# Altium footprint library Connector_art.PcbLib: 209 footprints (part 7 of 14)
Each footprint in its own frame and in the unit in brackets; x right, y up, seen from the top. Pads: shape width x height; smd on the part's side, far side on the other; paste and mask are expansions set on the pad; w line width, h text height; cw(c..) or ccw(c..) is an arc to the next point about the centre after c.
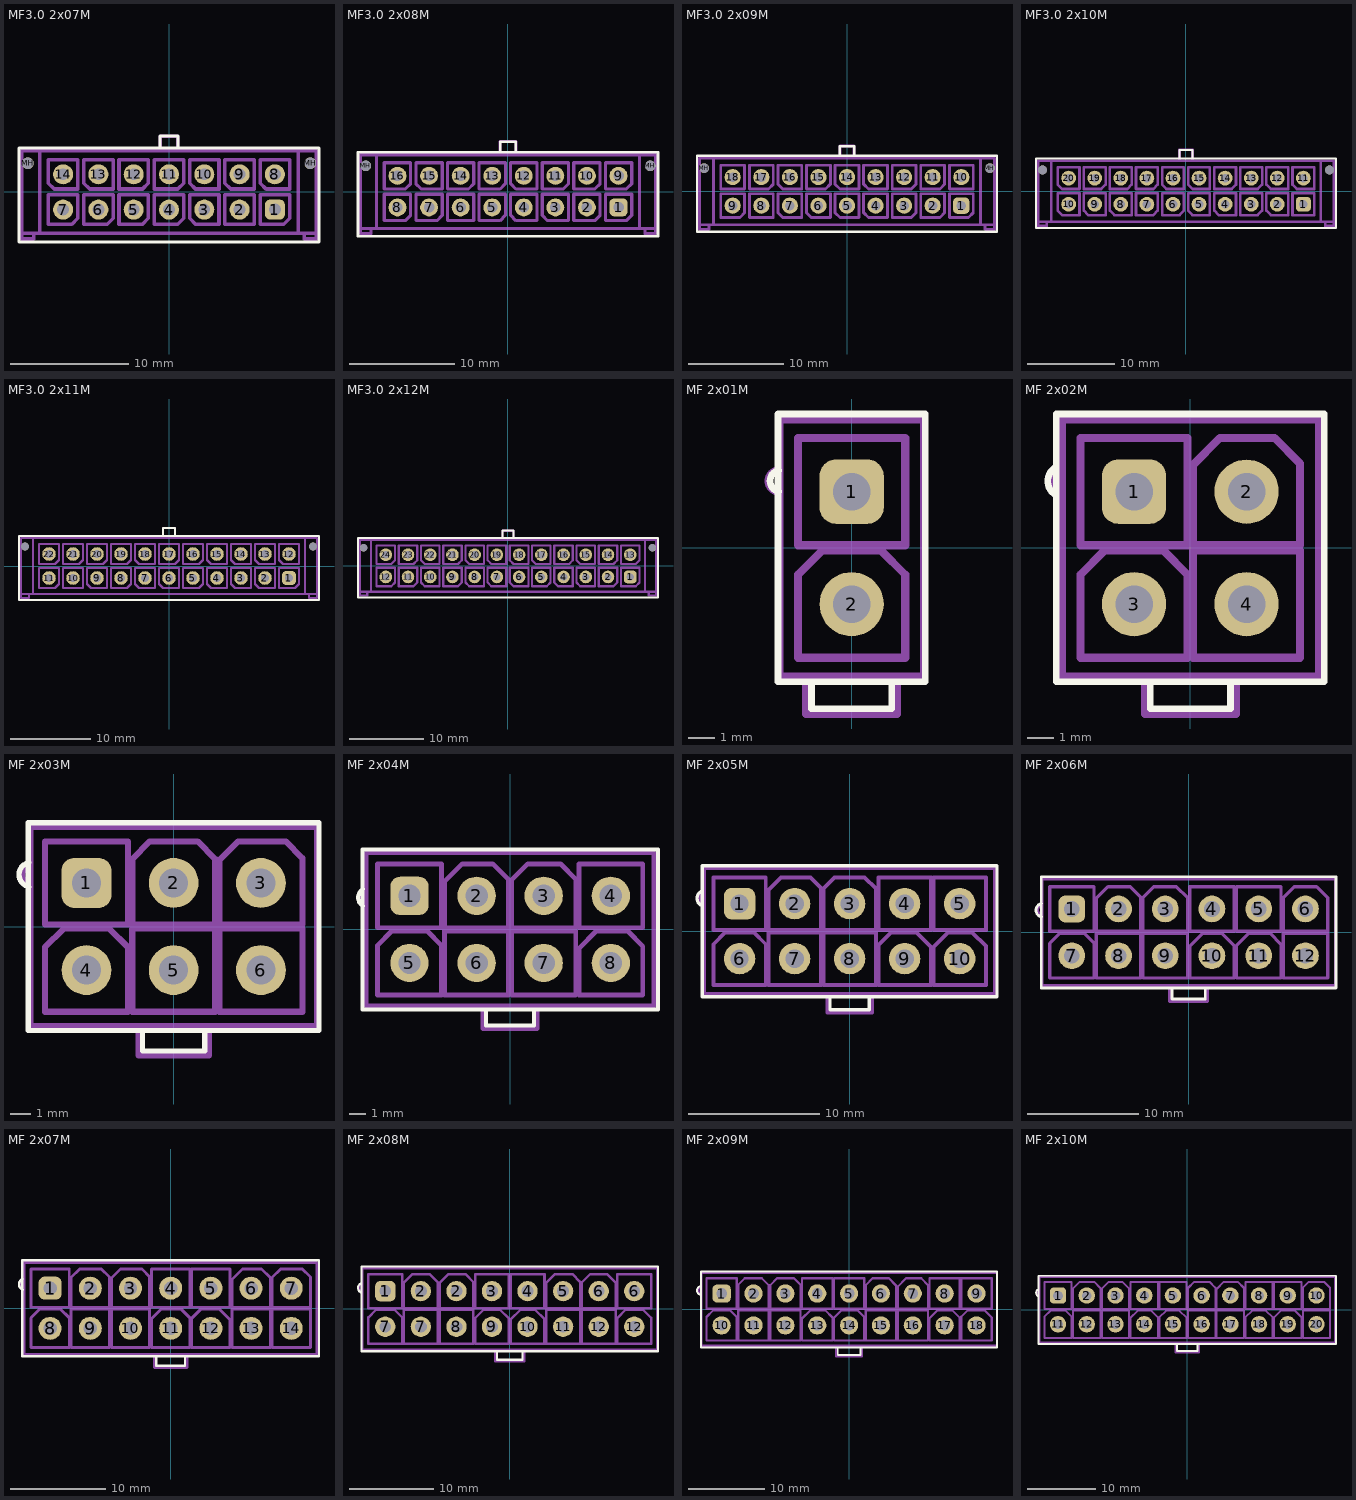
[diagram p6: the footprints below, top view; thin cyan lines are the x and y axes]

## MF3.0 2x07M [mm]
height 9.91
pads (16):
  rrect50% 1.7x1.7 hole 1 paste+0: 1(9,-1.5)
  round 1.7 hole 1: 2(6,-1.5) 3(3,-1.5) 4(0,-1.5) 5(-3,-1.5) 6(-6,-1.5) 7(-9,-1.5) 8(9,1.5) 9(6,1.5) 10(3,1.5) 11(0,1.5) 12(-3,1.5) 13(-6,1.5) 14(-9,1.5)
  round 1 hole 1 unplated: MH(-12,2.44) MH(12,2.44)
Top Overlay:
  lines w0.25: -0.75,3.75 -0.75,4.75 0.75,4.75 0.75,3.75 ; -12.75,-4.25 -12.75,3.75 12.75,3.75 12.75,-4.25 -12.75,-4.25
Mechanical 1:
  lines w0.3: -11.5,-3.5 -11.5,-4 -12.5,-4 -12.5,-3.5 ; -0.75,3.5 -0.75,4.75 0.75,4.75 0.75,3.5 ; 11.5,-3.5 11.5,-4 12.5,-4 12.5,-3.5 ; -12.5,-3.5 -12.5,3.5 -11,3.5 ; -12.5,-3.5 -11,-3.5 ; -11,-3.5 -11,3.5 ; -11,-3.5 11,-3.5 ; -11,3.5 11,3.5 ; 11,-3.5 11,3.5 ; 11,-3.5 12.5,-3.5 ; 11,3.5 12.5,3.5 12.5,-3.5 ; -10.25,-2.75 -8.25,-2.75 -7.75,-2.25 -7.75,-0.25 -10.25,-0.25 -10.25,-2.75 ; -10.25,0.75 -9.75,0.25 -7.75,0.25 -7.75,2.75 -10.25,2.75 -10.25,0.75 ; -7.25,-2.75 -5.25,-2.75 -4.75,-2.25 -4.75,-0.25 -7.25,-0.25 -7.25,-2.75 ; -7.25,0.75 -7.25,2.75 -4.75,2.75 -4.75,0.25 -6.75,0.25 -7.25,0.75 ; -4.25,-2.75 -4.25,-0.25 -1.75,-0.25 -1.75,-2.25 -2.25,-2.75 -4.25,-2.75 ; -4.25,0.25 -4.25,2.75 -1.75,2.75 -1.75,0.75 -2.25,0.25 -4.25,0.25 ; -1.25,-2.75 0.75,-2.75 1.25,-2.25 1.25,-0.25 -1.25,-0.25 -1.25,-2.75 ; -1.25,0.25 -1.25,2.75 1.25,2.75 1.25,0.75 0.75,0.25 -1.25,0.25 ; 1.75,-2.25 2.25,-2.75 4.25,-2.75 4.25,-0.25 1.75,-0.25 1.75,-2.25 ; 1.75,0.75 1.75,2.75 4.25,2.75 4.25,0.25 2.25,0.25 1.75,0.75 ; 4.75,-2.75 4.75,-0.25 7.25,-0.25 7.25,-2.75 4.75,-2.75 ; 4.75,0.75 4.75,2.75 7.25,2.75 7.25,0.25 5.25,0.25 4.75,0.75 ; 7.75,-2.75 9.75,-2.75 10.25,-2.25 10.25,-0.25 7.75,-0.25 7.75,-2.75 ; 7.75,0.75 7.75,2.75 10.25,2.75 10.25,0.25 8.25,0.25 7.75,0.75
3D body: height 9.91, standoff -3.18, extent -12.575,-3.97 12.575,4.8

## MF3.0 2x08M [mm]
height 9.91
pads (18):
  rrect50% 1.7x1.7 hole 1 paste+0: 1(10.5,-1.5)
  round 1.7 hole 1: 2(7.5,-1.5) 3(4.5,-1.5) 4(1.5,-1.5) 5(-1.5,-1.5) 6(-4.5,-1.5) 7(-7.5,-1.5) 8(-10.5,-1.5) 9(10.5,1.5) 10(7.5,1.5) 11(4.5,1.5) 12(1.5,1.5) 13(-1.5,1.5) 14(-4.5,1.5) 15(-7.5,1.5) 16(-10.5,1.5)
  round 1 hole 1 unplated: MH(-13.5,2.44) MH(13.5,2.44)
Top Overlay:
  lines w0.25: -0.75,3.75 -0.75,4.75 0.75,4.75 0.75,3.75 ; -14.25,-4.25 14.25,-4.25 14.25,3.75 -14.25,3.75 -14.25,-4.25
Mechanical 1:
  lines w0.3: -13,-3.5 -13,-4 -14,-4 -14,-3.5 ; -0.75,3.5 -0.75,4.75 0.75,4.75 0.75,3.5 ; 13,-3.5 13,-4 14,-4 14,-3.5 ; -14,-3.5 -12.5,-3.5 ; -14,-3.5 -14,3.5 -12.5,3.5 ; -12.5,-3.5 12.5,-3.5 ; -12.5,-3.5 -12.5,3.5 ; -12.5,3.5 12.5,3.5 ; 12.5,-3.5 14,-3.5 ; 12.5,-3.5 12.5,3.5 ; 12.5,3.5 14,3.5 14,-3.5 ; -11.75,-2.75 -9.75,-2.75 -9.25,-2.25 -9.25,-0.25 -11.75,-0.25 -11.75,-2.75 ; -11.75,0.25 -9.75,0.25 -9.25,0.75 -9.25,2.75 -11.75,2.75 -11.75,0.25 ; -8.75,-2.75 -8.75,-0.25 -6.25,-0.25 -6.25,-2.25 -6.75,-2.75 -8.75,-2.75 ; -8.75,0.75 -8.25,0.25 -6.25,0.25 -6.25,2.75 -8.75,2.75 -8.75,0.75 ; -5.75,-2.75 -3.25,-2.75 -3.25,-0.25 -5.75,-0.25 -5.75,-2.75 ; -5.75,0.25 -3.75,0.25 -3.25,0.75 -3.25,2.75 -5.75,2.75 -5.75,0.25 ; -2.75,-2.75 -0.75,-2.75 -0.25,-2.25 -0.25,-0.25 -2.75,-0.25 -2.75,-2.75 ; -2.75,0.25 -0.75,0.25 -0.25,0.75 -0.25,2.75 -2.75,2.75 -2.75,0.25 ; 0.25,-2.25 0.75,-2.75 2.75,-2.75 2.75,-0.25 0.25,-0.25 0.25,-2.25 ; 0.25,0.75 0.75,0.25 2.75,0.25 2.75,2.75 0.25,2.75 0.25,0.75 ; 3.25,-2.25 3.25,-0.25 5.75,-0.25 5.75,-2.75 3.75,-2.75 3.25,-2.25 ; 3.25,0.25 5.25,0.25 5.75,0.75 5.75,2.75 3.25,2.75 3.25,0.25 ; 6.25,-2.75 8.25,-2.75 8.75,-2.25 8.75,-0.25 6.25,-0.25 6.25,-2.75 ; 6.25,0.25 8.25,0.25 8.75,0.75 8.75,2.75 6.25,2.75 6.25,0.25 ; 9.25,-2.75 11.25,-2.75 11.75,-2.25 11.75,-0.25 9.25,-0.25 9.25,-2.75 ; 9.25,0.25 11.25,0.25 11.75,0.75 11.75,2.75 9.25,2.75 9.25,0.25
3D body: height 9.91, standoff -3.18, extent -14.075,-3.97 14.075,4.8

## MF3.0 2x09M [mm]
height 9.91
pads (20):
  rrect50% 1.7x1.7 hole 1 paste+0: 1(12,-1.5)
  round 1.7 hole 1: 2(9,-1.5) 3(6,-1.5) 4(3,-1.5) 5(0,-1.5) 6(-3,-1.5) 7(-6,-1.5) 8(-9,-1.5) 9(-12,-1.5) 10(12,1.5) 11(9,1.5) 12(6,1.5) 13(3,1.5) 14(0,1.5) 15(-3,1.5) 16(-6,1.5) 17(-9,1.5) 18(-12,1.5)
  round 1 hole 1 unplated: MH(-15,2.44) MH(15,2.44)
Top Overlay:
  lines w0.25: -0.75,3.75 -0.75,4.75 0.75,4.75 0.75,3.75 ; -15.75,-4.25 -15.75,3.75 15.75,3.75 15.75,-4.25 -15.75,-4.25
Mechanical 1:
  lines w0.3: -14.5,-3.5 -14.5,-4 -15.5,-4 -15.5,-3.5 ; -0.75,3.5 -0.75,4.75 0.75,4.75 0.75,3.5 ; 14.5,-3.5 14.5,-4 15.5,-4 15.5,-3.5 ; -15.5,-3.5 -15.5,3.5 -14,3.5 ; -15.5,-3.5 -14,-3.5 ; -14,-3.5 -14,3.5 ; -14,-3.5 14,-3.5 ; -14,3.5 14,3.5 ; 14,-3.5 14,3.5 ; 14,-3.5 15.5,-3.5 ; 14,3.5 15.5,3.5 15.5,-3.5 ; -13.25,-2.75 -13.25,-0.25 -10.75,-0.25 -10.75,-2.25 -11.25,-2.75 -13.25,-2.75 ; -13.25,0.25 -13.25,2.75 -10.75,2.75 -10.75,0.25 -13.25,0.25 ; -10.25,-2.75 -7.75,-2.75 -7.75,-0.25 -10.25,-0.25 -10.25,-2.75 ; -10.25,0.25 -8.25,0.25 -7.75,0.75 -7.75,2.75 -10.25,2.75 -10.25,0.25 ; -7.25,-2.25 -7.25,-0.25 -4.75,-0.25 -4.75,-2.75 -6.75,-2.75 -7.25,-2.25 ; -7.25,0.75 -7.25,2.75 -4.75,2.75 -4.75,0.25 -6.75,0.25 -7.25,0.75 ; -4.25,-2.25 -4.25,-0.25 -1.75,-0.25 -1.75,-2.75 -3.75,-2.75 -4.25,-2.25 ; -4.25,0.25 -4.25,2.75 -1.75,2.75 -1.75,0.75 -2.25,0.25 -4.25,0.25 ; -1.25,-2.25 -0.75,-2.75 1.25,-2.75 1.25,-0.25 -1.25,-0.25 -1.25,-2.25 ; -1.25,0.75 -0.75,0.25 1.25,0.25 1.25,2.75 -1.25,2.75 -1.25,0.75 ; 1.75,-2.25 2.25,-2.75 4.25,-2.75 4.25,-0.25 1.75,-0.25 1.75,-2.25 ; 1.75,0.75 1.75,2.75 4.25,2.75 4.25,0.25 2.25,0.25 1.75,0.75 ; 4.75,-2.75 6.75,-2.75 7.25,-2.25 7.25,-0.25 4.75,-0.25 4.75,-2.75 ; 4.75,0.25 6.75,0.25 7.25,0.75 7.25,2.75 4.75,2.75 4.75,0.25 ; 7.75,-2.75 9.75,-2.75 10.25,-2.25 10.25,-0.25 7.75,-0.25 7.75,-2.75 ; 7.75,0.25 9.75,0.25 10.25,0.75 10.25,2.75 7.75,2.75 7.75,0.25 ; 10.75,-2.75 12.75,-2.75 13.25,-2.25 13.25,-0.25 10.75,-0.25 10.75,-2.75 ; 10.75,0.25 10.75,2.75 13.25,2.75 13.25,0.25 10.75,0.25
3D body: height 9.91, standoff -3.18, extent -15.575,-3.97 15.575,4.8

## MF3.0 2x10M [mm]
height 9.91
pads (22):
  rrect50% 1.7x1.7 hole 1 paste+0: 1(13.5,-1.5)
  round 1.7 hole 1: 2(10.5,-1.5) 3(7.5,-1.5) 4(4.5,-1.5) 5(1.5,-1.5) 6(-1.5,-1.5) 7(-4.5,-1.5) 8(-7.5,-1.5) 9(-10.5,-1.5) 10(-13.5,-1.5) 11(13.5,1.5) 12(10.5,1.5) 13(7.5,1.5) 14(4.5,1.5) 15(1.5,1.5) 16(-1.5,1.5) 17(-4.5,1.5) 18(-7.5,1.5) 19(-10.5,1.5) 20(-13.5,1.5)
  round 1 hole 1 unplated: MH(-16.5,2.44) MH(16.5,2.44)
Top Overlay:
  lines w0.25: -0.75,3.75 -0.75,4.75 0.75,4.75 0.75,3.75 ; -17.25,-4.25 17.25,-4.25 17.25,3.75 -17.25,3.75 -17.25,-4.25
Mechanical 1:
  lines w0.3: -16,-3.5 -16,-4 -17,-4 -17,-3.5 ; -0.75,3.5 -0.75,4.75 0.75,4.75 0.75,3.5 ; 16,-3.5 16,-4 17,-4 17,-3.5 ; -17,-3.5 -15.5,-3.5 ; -17,-3.5 -17,3.5 -15.5,3.5 ; -15.5,-3.5 15.5,-3.5 ; -15.5,-3.5 -15.5,3.5 ; -15.5,3.5 15.5,3.5 ; 15.5,-3.5 17,-3.5 ; 15.5,-3.5 15.5,3.5 ; 15.5,3.5 17,3.5 17,-3.5 ; -14.75,-2.25 -14.25,-2.75 -12.25,-2.75 -12.25,-0.25 -14.75,-0.25 -14.75,-2.25 ; -14.75,0.75 -14.25,0.25 -12.25,0.25 -12.25,2.75 -14.75,2.75 -14.75,0.75 ; -11.75,-2.25 -11.25,-2.75 -9.25,-2.75 -9.25,-0.25 -11.75,-0.25 -11.75,-2.25 ; -11.75,0.25 -9.75,0.25 -9.25,0.75 -9.25,2.75 -11.75,2.75 -11.75,0.25 ; -8.75,-2.25 -8.25,-2.75 -6.25,-2.75 -6.25,-0.25 -8.75,-0.25 -8.75,-2.25 ; -8.75,0.25 -8.75,2.75 -6.25,2.75 -6.25,0.75 -6.75,0.25 -8.75,0.25 ; -5.75,-2.75 -5.75,-0.25 -3.25,-0.25 -3.25,-2.25 -3.75,-2.75 -5.75,-2.75 ; -5.75,0.25 -3.75,0.25 -3.25,0.75 -3.25,2.75 -5.75,2.75 -5.75,0.25 ; -2.75,-2.75 -0.75,-2.75 -0.25,-2.25 -0.25,-0.25 -2.75,-0.25 -2.75,-2.75 ; -2.75,0.75 -2.25,0.25 -0.25,0.25 -0.25,2.75 -2.75,2.75 -2.75,0.75 ; 0.25,-2.25 0.75,-2.75 2.75,-2.75 2.75,-0.25 0.25,-0.25 0.25,-2.25 ; 0.25,0.75 0.75,0.25 2.75,0.25 2.75,2.75 0.25,2.75 0.25,0.75 ; 3.25,-2.25 3.25,-0.25 5.75,-0.25 5.75,-2.75 3.75,-2.75 3.25,-2.25 ; 3.25,0.25 5.25,0.25 5.75,0.75 5.75,2.75 3.25,2.75 3.25,0.25 ; 6.25,-2.75 6.25,-0.25 8.75,-0.25 8.75,-2.25 8.25,-2.75 6.25,-2.75 ; 6.25,0.25 6.25,2.75 8.75,2.75 8.75,0.75 8.25,0.25 6.25,0.25 ; 9.25,-2.25 9.75,-2.75 11.75,-2.75 11.75,-0.25 9.25,-0.25 9.25,-2.25 ; 9.25,0.75 9.75,0.25 11.75,0.25 11.75,2.75 9.25,2.75 9.25,0.75 ; 12.25,-2.75 14.75,-2.75 14.75,-0.25 12.25,-0.25 12.25,-2.75 ; 12.25,0.75 12.75,0.25 14.75,0.25 14.75,2.75 12.25,2.75 12.25,0.75
3D body: height 9.91, standoff -3.18, extent -17.075,-3.97 17.075,4.8

## MF3.0 2x11M [mm]
height 9.91
pads (24):
  rrect50% 1.7x1.7 hole 1 paste+0: 1(15,-1.5)
  round 1.7 hole 1: 2(12,-1.5) 3(9,-1.5) 4(6,-1.5) 5(3,-1.5) 6(0,-1.5) 7(-3,-1.5) 8(-6,-1.5) 9(-9,-1.5) 10(-12,-1.5) 11(-15,-1.5) 12(15,1.5) 13(12,1.5) 14(9,1.5) 15(6,1.5) 16(3,1.5) 17(0,1.5) 18(-3,1.5) 19(-6,1.5) 20(-9,1.5) 21(-12,1.5) 22(-15,1.5)
  round 1 hole 1 unplated: MH(-18,2.44) MH(18,2.44)
Top Overlay:
  lines w0.25: -0.75,3.75 -0.75,4.75 0.75,4.75 0.75,3.75 ; -18.75,-4.25 -18.75,3.75 18.75,3.75 18.75,-4.25 -18.75,-4.25
Mechanical 1:
  lines w0.3: -17.5,-3.5 -17.5,-4 -18.5,-4 -18.5,-3.5 ; -0.75,3.5 -0.75,4.75 0.75,4.75 0.75,3.5 ; 17.5,-3.5 17.5,-4 18.5,-4 18.5,-3.5 ; -18.5,-3.5 -18.5,3.5 -17,3.5 ; -18.5,-3.5 -17,-3.5 ; -17,-3.5 -17,3.5 ; -17,-3.5 17,-3.5 ; -17,3.5 17,3.5 ; 17,-3.5 17,3.5 ; 17,-3.5 18.5,-3.5 ; 17,3.5 18.5,3.5 18.5,-3.5 ; -16.25,-2.75 -14.25,-2.75 -13.75,-2.25 -13.75,-0.25 -16.25,-0.25 -16.25,-2.75 ; -16.25,0.25 -14.25,0.25 -13.75,0.75 -13.75,2.75 -16.25,2.75 -16.25,0.25 ; -13.25,-2.75 -13.25,-0.25 -10.75,-0.25 -10.75,-2.75 -13.25,-2.75 ; -13.25,0.25 -11.25,0.25 -10.75,0.75 -10.75,2.75 -13.25,2.75 -13.25,0.25 ; -10.25,-2.25 -10.25,-0.25 -7.75,-0.25 -7.75,-2.75 -9.75,-2.75 -10.25,-2.25 ; -10.25,0.25 -8.25,0.25 -7.75,0.75 -7.75,2.75 -10.25,2.75 -10.25,0.25 ; -7.25,-2.75 -5.25,-2.75 -4.75,-2.25 -4.75,-0.25 -7.25,-0.25 -7.25,-2.75 ; -7.25,0.25 -5.25,0.25 -4.75,0.75 -4.75,2.75 -7.25,2.75 -7.25,0.25 ; -4.25,-2.25 -4.25,-0.25 -1.75,-0.25 -1.75,-2.75 -3.75,-2.75 -4.25,-2.25 ; -4.25,0.75 -3.75,0.25 -1.75,0.25 -1.75,2.75 -4.25,2.75 -4.25,0.75 ; -1.25,-2.25 -0.75,-2.75 1.25,-2.75 1.25,-0.25 -1.25,-0.25 -1.25,-2.25 ; -1.25,0.25 0.75,0.25 1.25,0.75 1.25,2.75 -1.25,2.75 -1.25,0.25 ; 1.75,-2.75 3.75,-2.75 4.25,-2.25 4.25,-0.25 1.75,-0.25 1.75,-2.75 ; 1.75,0.25 3.75,0.25 4.25,0.75 4.25,2.75 1.75,2.75 1.75,0.25 ; 4.75,-2.25 4.75,-0.25 7.25,-0.25 7.25,-2.75 5.25,-2.75 4.75,-2.25 ; 4.75,0.75 4.75,2.75 7.25,2.75 7.25,0.25 5.25,0.25 4.75,0.75 ; 7.75,-2.25 7.75,-0.25 10.25,-0.25 10.25,-2.75 8.25,-2.75 7.75,-2.25 ; 7.75,0.75 7.75,2.75 10.25,2.75 10.25,0.25 8.25,0.25 7.75,0.75 ; 10.75,-2.25 10.75,-0.25 13.25,-0.25 13.25,-2.75 11.25,-2.75 10.75,-2.25 ; 10.75,0.75 10.75,2.75 13.25,2.75 13.25,0.25 11.25,0.25 10.75,0.75 ; 13.75,-2.75 15.75,-2.75 16.25,-2.25 16.25,-0.25 13.75,-0.25 13.75,-2.75 ; 13.75,0.75 13.75,2.75 16.25,2.75 16.25,0.25 14.25,0.25 13.75,0.75
3D body: height 9.91, standoff -3.18, extent -18.575,-3.97 18.575,4.8

## MF3.0 2x12M [mm]
height 9.91
pads (26):
  rrect50% 1.7x1.7 hole 1 paste+0: 1(16.5,-1.5)
  round 1.7 hole 1: 2(13.5,-1.5) 3(10.5,-1.5) 4(7.5,-1.5) 5(4.5,-1.5) 6(1.5,-1.5) 7(-1.5,-1.5) 8(-4.5,-1.5) 9(-7.5,-1.5) 10(-10.5,-1.5) 11(-13.5,-1.5) 12(-16.5,-1.5) 13(16.5,1.5) 14(13.5,1.5) 15(10.5,1.5) 16(7.5,1.5) 17(4.5,1.5) 18(1.5,1.5) 19(-1.5,1.5) 20(-4.5,1.5) 21(-7.5,1.5) 22(-10.5,1.5) 23(-13.5,1.5) 24(-16.5,1.5)
  round 1 hole 1 unplated: MH(-19.5,2.44) MH(19.5,2.44)
Top Overlay:
  lines w0.25: -0.75,3.75 -0.75,4.75 0.75,4.75 0.75,3.75 ; -20.25,-4.25 20.25,-4.25 20.25,3.75 -20.25,3.75 -20.25,-4.25
Mechanical 1:
  lines w0.3: -19,-3.5 -19,-4 -20,-4 -20,-3.5 ; -0.75,3.5 -0.75,4.75 0.75,4.75 0.75,3.5 ; 19,-3.5 19,-4 20,-4 20,-3.5 ; -20,-3.5 -18.5,-3.5 ; -20,-3.5 -20,3.5 -18.5,3.5 ; -18.5,-3.5 18.5,-3.5 ; -18.5,-3.5 -18.5,3.5 ; -18.5,3.5 18.5,3.5 ; 18.5,-3.5 20,-3.5 ; 18.5,-3.5 18.5,3.5 ; 18.5,3.5 20,3.5 20,-3.5 ; -17.75,-2.75 -17.75,-0.25 -15.25,-0.25 -15.25,-2.25 -15.75,-2.75 -17.75,-2.75 ; -17.75,0.25 -17.75,2.75 -15.25,2.75 -15.25,0.75 -15.75,0.25 -17.75,0.25 ; -14.75,-2.75 -14.75,-0.25 -12.25,-0.25 -12.25,-2.25 -12.75,-2.75 -14.75,-2.75 ; -14.75,0.25 -14.75,2.75 -12.25,2.75 -12.25,0.75 -12.75,0.25 -14.75,0.25 ; -11.75,-2.25 -11.75,-0.25 -9.25,-0.25 -9.25,-2.75 -11.25,-2.75 -11.75,-2.25 ; -11.75,0.75 -11.25,0.25 -9.25,0.25 -9.25,2.75 -11.75,2.75 -11.75,0.75 ; -8.75,-2.75 -8.75,-0.25 -6.25,-0.25 -6.25,-2.25 -6.75,-2.75 -8.75,-2.75 ; -8.75,0.25 -8.75,2.75 -6.25,2.75 -6.25,0.75 -6.75,0.25 -8.75,0.25 ; -5.75,-2.25 -5.75,-0.25 -3.25,-0.25 -3.25,-2.75 -5.25,-2.75 -5.75,-2.25 ; -5.75,0.75 -5.75,2.75 -3.25,2.75 -3.25,0.25 -5.25,0.25 -5.75,0.75 ; -2.75,-2.25 -2.75,-0.25 -0.25,-0.25 -0.25,-2.75 -2.25,-2.75 -2.75,-2.25 ; -2.75,0.75 -2.75,2.75 -0.25,2.75 -0.25,0.25 -2.25,0.25 -2.75,0.75 ; 0.25,-2.25 0.25,-0.25 2.75,-0.25 2.75,-2.75 0.75,-2.75 0.25,-2.25 ; 0.25,0.75 0.75,0.25 2.75,0.25 2.75,2.75 0.25,2.75 0.25,0.75 ; 3.25,-2.75 3.25,-0.25 5.75,-0.25 5.75,-2.25 5.25,-2.75 3.25,-2.75 ; 3.25,0.75 3.75,0.25 5.75,0.25 5.75,2.75 3.25,2.75 3.25,0.75 ; 6.25,-2.25 6.25,-0.25 8.75,-0.25 8.75,-2.75 6.75,-2.75 6.25,-2.25 ; 6.25,0.25 6.25,2.75 8.75,2.75 8.75,0.75 8.25,0.25 6.25,0.25 ; 9.25,-2.25 9.75,-2.75 11.75,-2.75 11.75,-0.25 9.25,-0.25 9.25,-2.25 ; 9.25,0.75 9.25,2.75 11.75,2.75 11.75,0.25 9.75,0.25 9.25,0.75 ; 12.25,-2.75 12.25,-0.25 14.75,-0.25 14.75,-2.25 14.25,-2.75 12.25,-2.75 ; 12.25,0.25 12.25,2.75 14.75,2.75 14.75,0.75 14.25,0.25 12.25,0.25 ; 15.25,-2.75 17.25,-2.75 17.75,-2.25 17.75,-0.25 15.25,-0.25 15.25,-2.75 ; 15.25,0.25 17.25,0.25 17.75,0.75 17.75,2.75 15.25,2.75 15.25,0.25
3D body: height 9.91, standoff -3.18, extent -20.075,-3.97 20.075,4.8

## MF 2x01M [mm]
height 12.8
pads (2):
  rrect50% 2.4x2.4 hole 1.4 paste+0: 1(0,2.1)
  round 2.4 hole 1.4: 2(0,-2.1)
Top Overlay:
  lines w0.25: -2.728,2.108 cw(c-2.65,2.5) -2.728,2.892 ; -1.5,-5 -1.5,-6 1.5,-6 1.5,-5 ; -2.75,-5 2.75,-5 2.75,5 -2.75,5 -2.75,-5
Mechanical 1:
  lines w0.3: -2.7,2.1 cw(c-2.7,2.5) -2.7,2.9 ; -1.7,-4.8 -1.7,-6.2 1.7,-6.2 1.7,-4.8 ; -2.7,-4.8 2.7,-4.8 2.7,4.8 -2.7,4.8 -2.7,-4.8 ; -2,-4.1 -2,-1 -1.1,-0.1 1.1,-0.1 2,-1 2,-4.1 -2,-4.1 ; -2,0.1 -2,4.1 2,4.1 2,0.1 -2,0.1
3D body: height 12.8, standoff -3.5, extent -3.1,-6.2 2.7,4.8

## MF 2x02M [mm]
height 12.8
pads (4):
  rrect50% 2.4x2.4 hole 1.4 paste+0: 1(-2.1,2.1)
  round 2.4 hole 1.4: 2(2.1,2.1) 3(-2.1,-2.1) 4(2.1,-2.1)
Top Overlay:
  lines w0.25: -5.017,1.97 cw(c-4.722,2.492) -5.01,3.018 ; -1.5,-5 -1.5,-6 1.5,-6 1.5,-5 ; -5,-5 5,-5 5,5 -5,5 -5,-5
Mechanical 1:
  lines w0.3: -4.8,2.1 cw(c-4.8,2.5) -4.8,2.9 ; -2,0.1 2,0.1 ; -1.7,-4.8 -1.7,-6.2 1.7,-6.2 1.7,-4.8 ; -4.8,-4.8 4.8,-4.8 4.8,4.8 -4.8,4.8 -4.8,-4.8 ; -4.1,-4.1 -0.1,-4.1 -0.1,-1 -1,-0.1 -3.2,-0.1 -4.1,-1 -4.1,-4.1 ; -4.1,0.1 -0.1,0.1 -0.1,4.1 -4.1,4.1 -4.1,0.1 ; 0.1,-4.1 4.1,-4.1 4.1,-0.1 0.1,-0.1 0.1,-4.1 ; 0.1,0.1 0.1,3.1 1.1,4.1 3.15,4.1 4.1,3.15 4.1,0.1 0.1,0.1
3D body: height 12.8, standoff -3.5, extent -5.2,-6.2 4.8,4.8

## MF 2x03M [mm]
height 12.8
pads (6):
  rrect50% 2.4x2.4 hole 1.4 paste+0: 1(-4.2,2.1)
  round 2.4 hole 1.4: 2(0,2.1) 3(4.2,2.1) 4(-4.2,-2.1) 5(0,-2.1) 6(4.2,-2.1)
Top Overlay:
  lines w0.25: -6.968,1.912 cw(c-6.85,2.5) -6.968,3.088 ; -1.5,-5 -1.5,-6 1.5,-6 1.5,-5 ; -7,-5 -7,5 7,5 7,-5 -7,-5
Mechanical 1:
  lines w0.3: -6.9,2.1 cw(c-6.9,2.5) -6.9,2.9 ; -1.7,-4.8 -1.7,-6.2 1.7,-6.2 1.7,-4.8 ; -6.9,-4.8 -6.9,4.8 6.9,4.8 6.9,-4.8 -6.9,-4.8 ; -6.2,-4.1 -6.2,-1 -5.3,-0.1 -3.1,-0.1 -2.2,-1 -2.2,-4.1 -6.2,-4.1 ; -6.2,0.1 -6.2,4.1 -2.2,4.1 -2.2,0.1 -6.2,0.1 ; -2,-4.1 -2,-0.1 2,-0.1 2,-4.1 -2,-4.1 ; -2,0.1 -2,3.25 -1.15,4.1 1.15,4.1 2,3.25 2,0.1 -2,0.1 ; 2.2,-4.1 2.2,-0.1 6.2,-0.1 6.2,-4.1 2.2,-4.1 ; 2.2,0.1 2.2,3.2 3.1,4.1 5.4,4.1 6.2,3.3 6.2,0.1 2.2,0.1
3D body: height 12.8, standoff -3.5, extent -7.3,-6.2 6.9,4.8

## MF 2x04M [mm]
height 12.8
pads (8):
  rrect50% 2.4x2.4 hole 1.4 paste+0: 1(-6.3,2.1)
  round 2.4 hole 1.4: 2(-2.1,2.1) 3(2.1,2.1) 4(6.3,2.1) 5(-6.3,-2.1) 6(-2.1,-2.1) 7(2.1,-2.1) 8(6.3,-2.1)
Top Overlay:
  lines w0.25: -9.217,1.47 cw(c-8.922,1.992) -9.21,2.518 ; -1.5,-5 -1.5,-6 1.5,-6 1.5,-5 ; -9.25,-5 -9.25,5 9.25,5 9.25,-5 -9.25,-5
Mechanical 1:
  lines w0.3: -9,1.6 cw(c-9,2) -9,2.4 ; -2,0.1 2,0.1 ; -1.7,-4.8 -1.7,-6.2 1.7,-6.2 1.7,-4.8 ; -9,-4.8 -9,4.8 9,4.8 9,-4.8 -9,-4.8 ; -8.3,-4.1 -4.3,-4.1 -4.3,-1 -5.2,-0.1 -7.4,-0.1 -8.3,-1 -8.3,-4.1 ; -8.3,0.1 -4.3,0.1 -4.3,4.1 -8.3,4.1 -8.3,0.1 ; -4.1,-4.1 -4.1,-0.1 -0.1,-0.1 -0.1,-4.1 -4.1,-4.1 ; -4.1,0.1 -0.1,0.1 -0.1,3.1 -1.1,4.1 -3,4.1 -4.1,3 -4.1,0.1 ; 0.1,-4.1 0.1,-0.1 4.1,-0.1 4.1,-4.1 0.1,-4.1 ; 0.1,0.1 4.1,0.1 4.1,3.15 3.15,4.1 1.1,4.1 0.1,3.1 0.1,0.1 ; 4.3,-4.1 8.3,-4.1 8.3,-1.05 7.35,-0.1 5.4,-0.1 4.3,-1.2 4.3,-4.1 ; 4.3,0.1 4.3,4.1 8.3,4.1 8.3,0.1 4.3,0.1
3D body: height 12.8, standoff -3.5, extent -9.4,-6.2 9,4.8

## MF 2x05M [mm]
height 12.8
pads (10):
  rrect50% 2.4x2.4 hole 1.4 paste+0: 1(-8.4,2.1)
  round 2.4 hole 1.4: 2(-4.2,2.1) 3(0,2.1) 4(4.2,2.1) 5(8.4,2.1) 6(-8.4,-2.1) 7(-4.2,-2.1) 8(0,-2.1) 9(4.2,-2.1) 10(8.4,-2.1)
Top Overlay:
  lines w0.25: -11.273,1.943 cw(c-11.05,2.5) -11.273,3.057 ; -1.5,-5 -1.5,-6 1.5,-6 1.5,-5 ; -11.25,-5 -11.25,5 11.25,5 11.25,-5 -11.25,-5
Mechanical 1:
  lines w0.3: -11.1,2.1 cw(c-11.1,2.5) -11.1,2.9 ; -1.7,-4.8 -1.7,-6.2 1.7,-6.2 1.7,-4.8 ; -11.1,-4.8 -11.1,4.8 11.1,4.8 11.1,-4.8 -11.1,-4.8 ; -10.4,-4.1 -6.4,-4.1 -6.4,-1 -7.3,-0.1 -9.5,-0.1 -10.4,-1 -10.4,-4.1 ; -10.4,0.1 -6.4,0.1 -6.4,4.1 -10.4,4.1 -10.4,0.1 ; -6.2,-4.1 -6.2,-0.1 -2.2,-0.1 -2.2,-4.1 -6.2,-4.1 ; -6.2,0.1 -2.2,0.1 -2.2,3.3 -3,4.1 -5.25,4.1 -6.2,3.15 -6.2,0.1 ; -2,-4.1 -2,-0.1 2,-0.1 2,-4.1 -2,-4.1 ; -2,0.1 -2,3.25 -1.15,4.1 1.15,4.1 2,3.25 2,0.1 -2,0.1 ; 2.2,-4.1 6.2,-4.1 6.2,-1.2 5.1,-0.1 3.15,-0.1 2.2,-1.05 2.2,-4.1 ; 2.2,0.1 2.2,4.1 6.2,4.1 6.2,0.1 2.2,0.1 ; 6.4,-4.1 6.4,-1.2 7.5,-0.1 9.35,-0.1 10.4,-1.15 10.4,-4.1 6.4,-4.1 ; 6.4,0.1 10.4,0.1 10.4,4.1 6.4,4.1 6.4,0.1
3D body: height 12.8, standoff -3.5, extent -11.5,-6.2 11.1,4.8

## MF 2x06M [mm]
height 12.8
pads (12):
  rrect50% 2.4x2.4 hole 1.4 paste+0: 1(-10.5,2.1)
  round 2.4 hole 1.4: 2(-6.3,2.1) 3(-2.1,2.1) 4(2.1,2.1) 5(6.3,2.1) 6(10.5,2.1) 7(-10.5,-2.1) 8(-6.3,-2.1) 9(-2.1,-2.1) 10(2.1,-2.1) 11(6.3,-2.1) 12(10.5,-2.1)
Top Overlay:
  lines w0.25: -13.239,1.404 cw(c-13.122,1.992) -13.235,2.581 ; -1.5,-5 -1.5,-6 1.5,-6 1.5,-5 ; -13.25,-5 13.25,-5 13.25,5 -13.25,5 -13.25,-5
Mechanical 1:
  lines w0.3: -13.2,1.6 cw(c-13.2,2) -13.2,2.4 ; -2,0.1 2,0.1 ; -1.7,-4.8 -1.7,-6.2 1.7,-6.2 1.7,-4.8 ; -13.2,-4.8 13.2,-4.8 13.2,4.8 -13.2,4.8 -13.2,-4.8 ; -12.5,-4.1 -8.5,-4.1 -8.5,-1 -9.4,-0.1 -11.6,-0.1 -12.5,-1 -12.5,-4.1 ; -12.5,0.1 -8.5,0.1 -8.5,4.1 -12.5,4.1 -12.5,0.1 ; -8.3,-4.1 -8.3,-0.1 -4.3,-0.1 -4.3,-4.1 -8.3,-4.1 ; -8.3,0.1 -4.3,0.1 -4.3,3.15 -5.25,4.1 -7.25,4.1 -8.3,3.05 -8.3,0.1 ; -4.1,-4.1 -0.1,-4.1 -0.1,-0.1 -4.1,-0.1 -4.1,-4.1 ; -4.1,0.1 -0.1,0.1 -0.1,3.1 -1.1,4.1 -3.15,4.1 -4.1,3.15 -4.1,0.1 ; 0.1,-4.1 4.1,-4.1 4.1,-1.2 3,-0.1 1.25,-0.1 0.1,-1.25 0.1,-4.1 ; 0.1,0.1 0.1,4.1 4.1,4.1 4.1,0.1 0.1,0.1 ; 4.3,-4.1 4.3,-1.2 5.4,-0.1 7.35,-0.1 8.3,-1.05 8.3,-4.1 4.3,-4.1 ; 4.3,0.1 8.3,0.1 8.3,4.1 4.3,4.1 4.3,0.1 ; 8.5,-4.1 12.5,-4.1 12.5,-0.1 8.5,-0.1 8.5,-4.1 ; 8.5,0.1 12.5,0.1 12.5,3.1 11.5,4.1 9.5,4.1 8.5,3.1 8.5,0.1
3D body: height 12.8, standoff -3.5, extent -13.6,-6.2 13.2,4.8

## MF 2x07M [mm]
height 12.8
pads (14):
  rrect50% 2.4x2.4 hole 1.4 paste+0: 1(-12.6,2.1)
  round 2.4 hole 1.4: 2(-8.4,2.1) 3(-4.2,2.1) 4(0,2.1) 5(4.2,2.1) 6(8.4,2.1) 7(12.6,2.1) 8(-12.6,-2.1) 9(-8.4,-2.1) 10(-4.2,-2.1) 11(0,-2.1) 12(4.2,-2.1) 13(8.4,-2.1) 14(12.6,-2.1)
Top Overlay:
  lines w0.25: -15.473,1.943 cw(c-15.25,2.5) -15.473,3.057 ; -1.5,-5 -1.5,-6 1.5,-6 1.5,-5 ; -15.5,-5 -15.5,5 15.5,5 15.5,-5 -15.5,-5
Mechanical 1:
  lines w0.3: -15.3,2.1 cw(c-15.3,2.5) -15.3,2.9 ; -1.7,-4.8 -1.7,-6.2 1.7,-6.2 1.7,-4.8 ; -15.3,-4.8 -15.3,4.8 15.3,4.8 15.3,-4.8 -15.3,-4.8 ; -14.6,-4.1 -14.6,-1 -13.7,-0.1 -11.5,-0.1 -10.6,-1 -10.6,-4.1 -14.6,-4.1 ; -14.6,0.1 -14.6,4.1 -10.6,4.1 -10.6,0.1 -14.6,0.1 ; -10.4,-4.1 -6.4,-4.1 -6.4,-0.1 -10.4,-0.1 -10.4,-4.1 ; -10.4,0.1 -10.4,3.2 -9.5,4.1 -7.25,4.1 -6.4,3.25 -6.4,0.1 -10.4,0.1 ; -6.2,-4.1 -6.2,-0.1 -2.2,-0.1 -2.2,-4.1 -6.2,-4.1 ; -6.2,0.1 -2.2,0.1 -2.2,3.3 -3,4.1 -5.25,4.1 -6.2,3.15 -6.2,0.1 ; -2,-4.1 -2,-1.1 -1,-0.1 1.1,-0.1 2,-1 2,-4.1 -2,-4.1 ; -2,0.1 -2,4.1 2,4.1 2,0.1 -2,0.1 ; 2.2,-4.1 6.2,-4.1 6.2,-1.2 5.1,-0.1 3.15,-0.1 2.2,-1.05 2.2,-4.1 ; 2.2,0.1 2.2,4.1 6.2,4.1 6.2,0.1 2.2,0.1 ; 6.4,-4.1 6.4,-0.1 10.4,-0.1 10.4,-4.1 6.4,-4.1 ; 6.4,0.1 6.4,3 7.5,4.1 9.5,4.1 10.4,3.2 10.4,0.1 6.4,0.1 ; 10.6,-4.1 14.6,-4.1 14.6,-0.1 10.6,-0.1 10.6,-4.1 ; 10.6,0.1 10.6,3.2 11.5,4.1 13.75,4.1 14.6,3.25 14.6,0.1 10.6,0.1
3D body: height 12.8, standoff -3.5, extent -15.7,-6.2 15.3,4.8

## MF 2x08M [mm]
height 12.8
pads (16):
  rrect50% 2.4x2.4 hole 1.4 paste+0: 1(-14.7,2.1)
  round 2.4 hole 1.4: 2(-10.5,2.1) 2(-6.3,2.1) 3(-2.1,2.1) 4(2.1,2.1) 5(6.3,2.1) 6(10.5,2.1) 6(14.7,2.1) 7(-14.7,-2.1) 7(-10.5,-2.1) 8(-6.3,-2.1) 9(-2.1,-2.1) 10(2.1,-2.1) 11(6.3,-2.1) 12(10.5,-2.1) 12(14.7,-2.1)
Top Overlay:
  lines w0.25: -17.526,1.928 cw(c-17.322,2.492) -17.52,3.058 ; -1.5,-5 -1.5,-6 1.5,-6 1.5,-5 ; -17.5,-5 -17.5,5 17.5,5 17.5,-5 -17.5,-5
Mechanical 1:
  lines w0.3: -17.4,2.1 cw(c-17.4,2.5) -17.4,2.9 ; -2,0.1 2,0.1 ; -1.7,-4.8 -1.7,-6.2 1.7,-6.2 1.7,-4.8 ; -17.4,-4.8 -17.4,4.8 17.4,4.8 17.4,-4.8 -17.4,-4.8 ; -16.7,-4.1 -12.7,-4.1 -12.7,-1 -13.6,-0.1 -15.8,-0.1 -16.7,-1 -16.7,-4.1 ; -16.7,0.1 -12.7,0.1 -12.7,4.1 -16.7,4.1 -16.7,0.1 ; -12.5,-4.1 -12.5,-0.1 -8.5,-0.1 -8.5,-4.1 -12.5,-4.1 ; -12.5,0.1 -12.5,3.1 -11.5,4.1 -9.5,4.1 -8.5,3.1 -8.5,0.1 -12.5,0.1 ; -8.3,-4.1 -4.3,-4.1 -4.3,-0.1 -8.3,-0.1 -8.3,-4.1 ; -8.3,0.1 -8.3,3.05 -7.25,4.1 -5.25,4.1 -4.3,3.15 -4.3,0.1 -8.3,0.1 ; -4.1,-4.1 -4.1,-1.1 -3.1,-0.1 -1.15,-0.1 -0.1,-1.15 -0.1,-4.1 -4.1,-4.1 ; -4.1,0.1 -4.1,4.1 -0.1,4.1 -0.1,0.1 -4.1,0.1 ; 0.1,-4.1 0.1,-1.25 1.25,-0.1 3,-0.1 4.1,-1.2 4.1,-4.1 0.1,-4.1 ; 0.1,0.1 4.1,0.1 4.1,4.1 0.1,4.1 0.1,0.1 ; 4.3,-4.1 8.3,-4.1 8.3,-0.1 4.3,-0.1 4.3,-4.1 ; 4.3,0.1 4.3,3.05 5.35,4.1 7.4,4.1 8.3,3.2 8.3,0.1 4.3,0.1 ; 8.5,-4.1 8.5,-0.1 12.5,-0.1 12.5,-4.1 8.5,-4.1 ; 8.5,0.1 8.5,3.1 9.5,4.1 11.5,4.1 12.5,3.1 12.5,0.1 8.5,0.1 ; 12.7,-4.1 12.7,-1.05 13.65,-0.1 15.75,-0.1 16.7,-1.05 16.7,-4.1 12.7,-4.1 ; 12.7,0.1 16.7,0.1 16.7,4.1 12.7,4.1 12.7,0.1
3D body: height 12.8, standoff -3.5, extent -17.8,-6.2 17.4,4.8

## MF 2x09M [mm]
height 12.8
pads (18):
  rrect50% 2.4x2.4 hole 1.4 paste+0: 1(-16.8,2.1)
  round 2.4 hole 1.4: 2(-12.6,2.1) 3(-8.4,2.1) 4(-4.2,2.1) 5(0,2.1) 6(4.2,2.1) 7(8.4,2.1) 8(12.6,2.1) 9(16.8,2.1) 10(-16.8,-2.1) 11(-12.6,-2.1) 12(-8.4,-2.1) 13(-4.2,-2.1) 14(0,-2.1) 15(4.2,-2.1) 16(8.4,-2.1) 17(12.6,-2.1) 18(16.8,-2.1)
Top Overlay:
  lines w0.25: -19.51,1.903 cw(c-19.45,2.5) -19.51,3.097 ; -1.5,-5 -1.5,-6 1.5,-6 1.5,-5 ; -19.5,-5 -19.5,5 19.5,5 19.5,-5 -19.5,-5
Mechanical 1:
  lines w0.3: -19.5,2.1 cw(c-19.5,2.5) -19.5,2.9 ; -1.7,-4.8 -1.7,-6.2 1.7,-6.2 1.7,-4.8 ; -19.5,-4.8 -19.5,4.8 19.5,4.8 19.5,-4.8 -19.5,-4.8 ; -18.8,-4.1 -14.8,-4.1 -14.8,-1 -15.7,-0.1 -17.9,-0.1 -18.8,-1 -18.8,-4.1 ; -18.8,0.1 -14.8,0.1 -14.8,4.1 -18.8,4.1 -18.8,0.1 ; -14.6,-4.1 -14.6,-0.1 -10.6,-0.1 -10.6,-4.1 -14.6,-4.1 ; -14.6,0.1 -14.6,3.25 -13.75,4.1 -11.5,4.1 -10.6,3.2 -10.6,0.1 -14.6,0.1 ; -10.4,-4.1 -6.4,-4.1 -6.4,-0.1 -10.4,-0.1 -10.4,-4.1 ; -10.4,0.1 -10.4,3.2 -9.5,4.1 -7.25,4.1 -6.4,3.25 -6.4,0.1 -10.4,0.1 ; -6.2,-4.1 -6.2,-1.2 -5.1,-0.1 -3.15,-0.1 -2.2,-1.05 -2.2,-4.1 -6.2,-4.1 ; -6.2,0.1 -2.2,0.1 -2.2,4.1 -6.2,4.1 -6.2,0.1 ; -2,-4.1 -2,-1.1 -1,-0.1 1.1,-0.1 2,-1 2,-4.1 -2,-4.1 ; -2,0.1 -2,4.1 2,4.1 2,0.1 -2,0.1 ; 2.2,-4.1 6.2,-4.1 6.2,-0.1 2.2,-0.1 2.2,-4.1 ; 2.2,0.1 2.2,3.2 3.1,4.1 5.25,4.1 6.2,3.15 6.2,0.1 2.2,0.1 ; 6.4,-4.1 6.4,-0.1 10.4,-0.1 10.4,-4.1 6.4,-4.1 ; 6.4,0.1 6.4,3 7.5,4.1 9.5,4.1 10.4,3.2 10.4,0.1 6.4,0.1 ; 10.6,-4.1 10.6,-1.15 11.65,-0.1 13.6,-0.1 14.6,-1.1 14.6,-4.1 10.6,-4.1 ; 10.6,0.1 10.6,4.1 14.6,4.1 14.6,0.1 10.6,0.1 ; 14.8,-4.1 14.8,-0.95 15.65,-0.1 17.85,-0.1 18.8,-1.05 18.8,-4.1 14.8,-4.1 ; 14.8,0.1 18.8,0.1 18.8,4.1 14.8,4.1 14.8,0.1
3D body: height 12.8, standoff -3.5, extent -19.9,-6.2 19.5,4.8

## MF 2x10M [mm]
height 12.8
pads (20):
  rrect50% 2.4x2.4 hole 1.4 paste+0: 1(-18.9,2.1)
  round 2.4 hole 1.4: 2(-14.7,2.1) 3(-10.5,2.1) 4(-6.3,2.1) 5(-2.1,2.1) 6(2.1,2.1) 7(6.3,2.1) 8(10.5,2.1) 9(14.7,2.1) 10(18.9,2.1) 11(-18.9,-2.1) 12(-14.7,-2.1) 13(-10.5,-2.1) 14(-6.3,-2.1) 15(-2.1,-2.1) 16(2.1,-2.1) 17(6.3,-2.1) 18(10.5,-2.1) 19(14.7,-2.1) 20(18.9,-2.1)
Top Overlay:
  lines w0.25: -21.726,1.928 cw(c-21.522,2.492) -21.72,3.058 ; -1.5,-5 -1.5,-6 1.5,-6 1.5,-5 ; -21.75,-5 21.75,-5 21.75,5 -21.75,5 -21.75,-5
Mechanical 1:
  lines w0.3: -21.6,2.1 cw(c-21.6,2.5) -21.6,2.9 ; -2,0.1 2,0.1 ; -1.7,-4.8 -1.7,-6.2 1.7,-6.2 1.7,-4.8 ; -21.6,-4.8 21.6,-4.8 21.6,4.8 -21.6,4.8 -21.6,-4.8 ; -20.9,-4.1 -16.9,-4.1 -16.9,-1 -17.8,-0.1 -20,-0.1 -20.9,-1 -20.9,-4.1 ; -20.9,0.1 -16.9,0.1 -16.9,4.1 -20.9,4.1 -20.9,0.1 ; -16.7,-4.1 -16.7,-0.1 -12.7,-0.1 -12.7,-4.1 -16.7,-4.1 ; -16.7,0.1 -12.7,0.1 -12.7,3.2 -13.6,4.1 -15.75,4.1 -16.7,3.15 -16.7,0.1 ; -12.5,-4.1 -8.5,-4.1 -8.5,-0.1 -12.5,-0.1 -12.5,-4.1 ; -12.5,0.1 -8.5,0.1 -8.5,3.1 -9.5,4.1 -11.5,4.1 -12.5,3.1 -12.5,0.1 ; -8.3,-4.1 -4.3,-4.1 -4.3,-1.05 -5.25,-0.1 -7.25,-0.1 -8.3,-1.15 -8.3,-4.1 ; -8.3,0.1 -4.3,0.1 -4.3,4.1 -8.3,4.1 -8.3,0.1 ; -4.1,-4.1 -0.1,-4.1 -0.1,-1.15 -1.15,-0.1 -3.1,-0.1 -4.1,-1.1 -4.1,-4.1 ; -4.1,0.1 -0.1,0.1 -0.1,4.1 -4.1,4.1 -4.1,0.1 ; 0.1,-4.1 4.1,-4.1 4.1,-0.1 0.1,-0.1 0.1,-4.1 ; 0.1,0.1 4.1,0.1 4.1,3.25 3.25,4.1 1,4.1 0.1,3.2 0.1,0.1 ; 4.3,-4.1 4.3,-0.1 8.3,-0.1 8.3,-4.1 4.3,-4.1 ; 4.3,0.1 8.3,0.1 8.3,3.2 7.4,4.1 5.35,4.1 4.3,3.05 4.3,0.1 ; 8.5,-4.1 12.5,-4.1 12.5,-1.1 11.5,-0.1 9.5,-0.1 8.5,-1.1 8.5,-4.1 ; 8.5,0.1 12.5,0.1 12.5,4.1 8.5,4.1 8.5,0.1 ; 12.7,-4.1 16.7,-4.1 16.7,-1.05 15.75,-0.1 13.65,-0.1 12.7,-1.05 12.7,-4.1 ; 12.7,0.1 12.7,4.1 16.7,4.1 16.7,0.1 12.7,0.1 ; 16.9,-4.1 16.9,-0.1 20.9,-0.1 20.9,-4.1 16.9,-4.1 ; 16.9,0.1 20.9,0.1 20.9,3.2 20,4.1 17.75,4.1 16.9,3.25 16.9,0.1
3D body: height 12.8, standoff -3.5, extent -22,-6.2 21.6,4.8